# Altium footprint library ic.PcbLib: 116 footprints (part 6 of 8)
Each footprint in its own frame and in the unit in brackets; x right, y up, seen from the top. Pads: shape width x height; smd on the part's side, far side on the other; paste and mask are expansions set on the pad; w line width, h text height; cw(c..) or ccw(c..) is an arc to the next point about the centre after c.
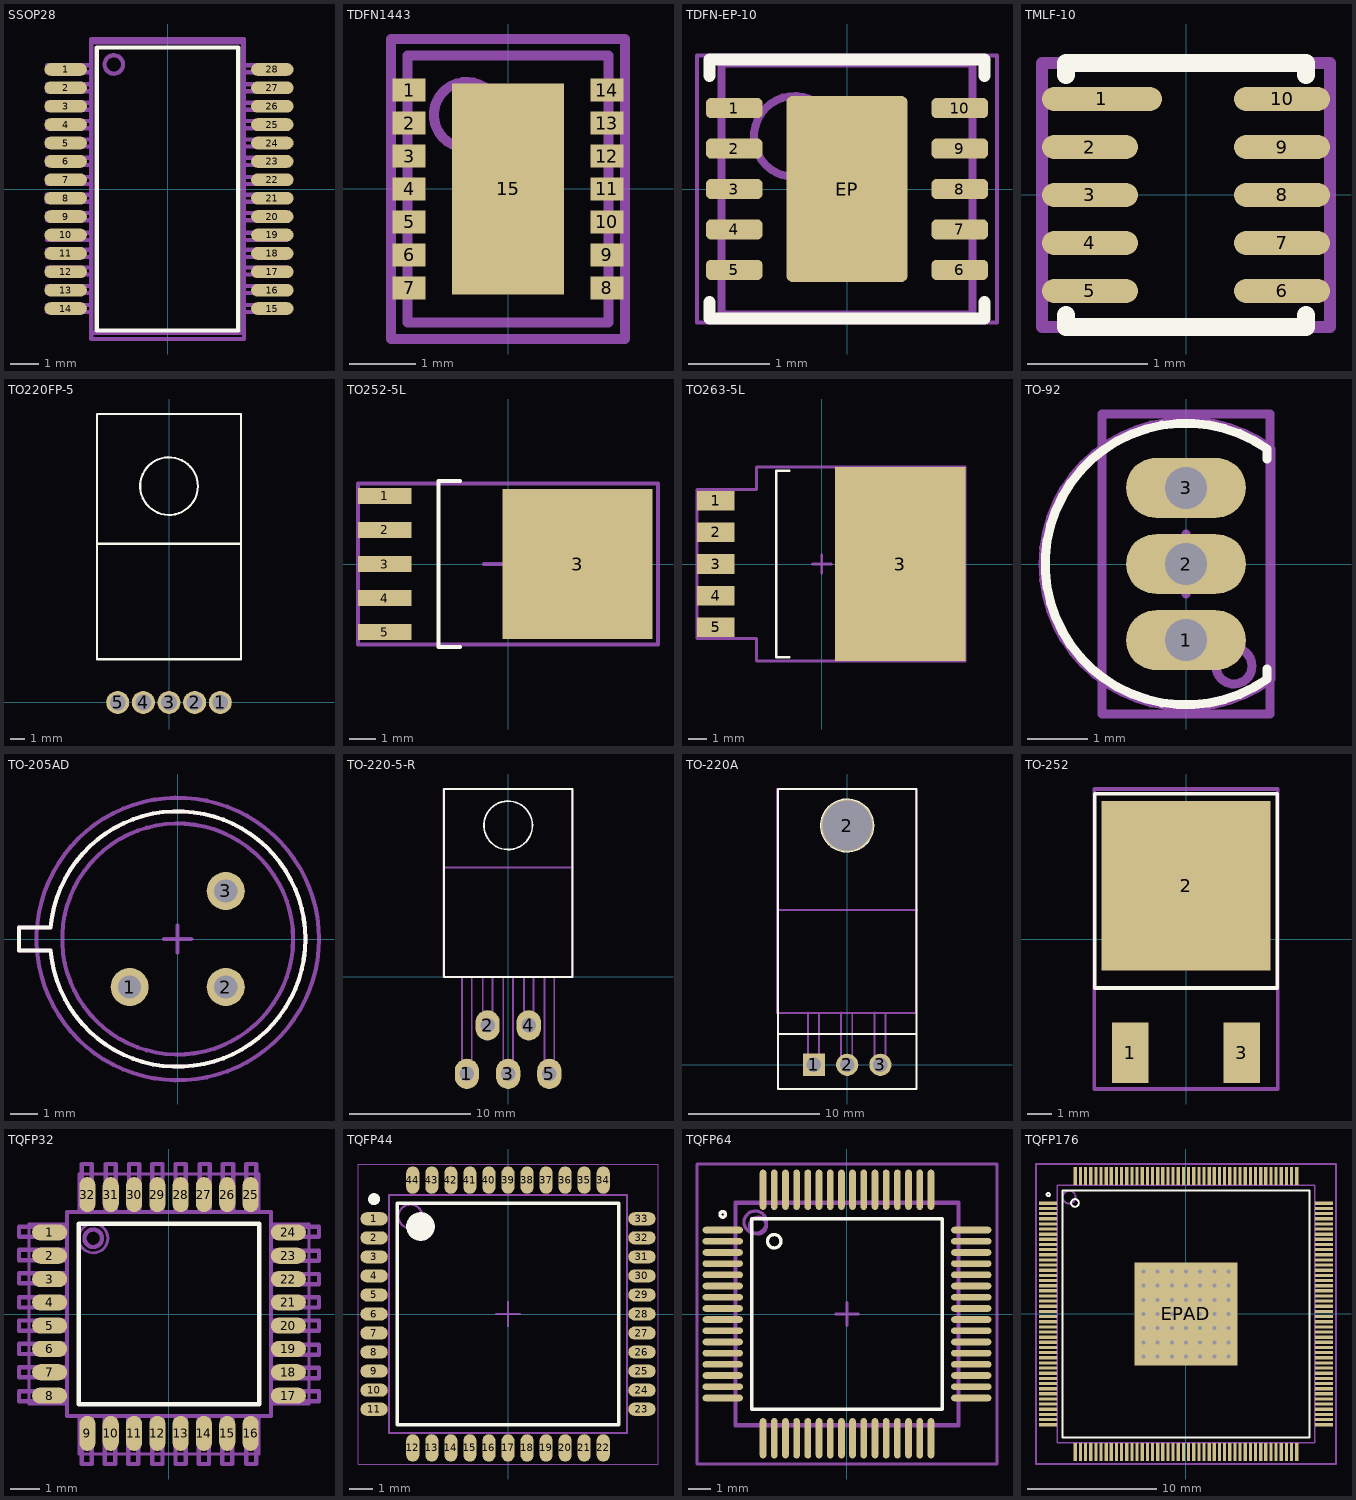
[diagram p5: the footprints below, top view; thin cyan lines are the x and y axes]

## SSOP28 [mm] "SOP, 28-Leads, Body 10.2x5.3mm, Pitch 0.65mm, IPC Medium Density"
height 1.99
pads (28):
  oval 1.5x0.45 smd: 1(-3.6,4.225) 2(-3.6,3.575) 3(-3.6,2.925) 4(-3.6,2.275) 5(-3.6,1.625) 6(-3.6,0.975) 7(-3.6,0.325) 8(-3.6,-0.325) 9(-3.6,-0.975) 10(-3.6,-1.625) 11(-3.6,-2.275) 12(-3.6,-2.925) 13(-3.6,-3.575) 14(-3.6,-4.225) 15(3.7,-4.225) 16(3.7,-3.575) 17(3.7,-2.925) 18(3.7,-2.275) 19(3.7,-1.625) 20(3.7,-0.975) 21(3.7,-0.325) 22(3.7,0.325) 23(3.7,0.975) 24(3.7,1.625) 25(3.7,2.275) 26(3.7,2.925) 27(3.7,3.575) 28(3.7,4.225)
Top Overlay:
  lines w0.15: -2.5,-5 -2.5,5 2.5,5 2.5,-5 -2.5,-5
  text "." at -3.9,4.9 h0.1
Mechanical 29:
  circle w0.15: c-1.9,4.4 r0.326
  lines w0.15: -2.725,-0.425 -2.725,-0.45 -4.275,-0.45 -4.275,-0.2 -2.725,-0.2 ; -2.7,-4.325 -2.7,-4.35 -4.25,-4.35 -4.25,-4.1 -2.7,-4.1 ; -2.7,-3.65 -2.7,-3.675 -4.25,-3.675 -4.25,-3.425 -2.7,-3.425 ; -2.7,-3 -2.7,-3.025 -4.25,-3.025 -4.25,-2.775 -2.7,-2.775 ; -2.7,-2.375 -2.7,-2.4 -4.25,-2.4 -4.25,-2.15 -2.7,-2.15 ; -2.7,-1.775 -2.7,-1.8 -4.25,-1.8 -4.25,-1.55 -2.7,-1.55 ; -2.7,-1.075 -2.7,-1.1 -4.25,-1.1 -4.25,-0.85 -2.7,-0.85 ; -2.7,0.2 -2.7,0.175 -4.25,0.175 -4.25,0.425 -2.7,0.425 ; -2.7,0.875 -2.7,0.85 -4.25,0.85 -4.25,1.1 -2.7,1.1 ; -2.7,1.525 -2.7,1.5 -4.25,1.5 -4.25,1.75 -2.7,1.75 ; -2.7,2.175 -2.7,2.15 -4.25,2.15 -4.25,2.4 -2.7,2.4 ; -2.7,2.825 -2.7,2.8 -4.25,2.8 -4.25,3.05 -2.7,3.05 ; -2.7,3.475 -2.7,3.45 -4.25,3.45 -4.25,3.7 -2.7,3.7 ; -2.7,4.15 -2.7,4.125 -4.25,4.125 -4.25,4.375 -2.7,4.375 ; 2.675,-4.325 2.675,-4.35 4.225,-4.35 4.225,-4.1 2.675,-4.1 ; 2.675,-3.65 2.675,-3.675 4.225,-3.675 4.225,-3.425 2.675,-3.425 ; 2.675,-3 2.675,-3.025 4.225,-3.025 4.225,-2.775 2.675,-2.775 ; 2.675,-2.375 2.675,-2.4 4.225,-2.4 4.225,-2.15 2.675,-2.15 ; 2.675,-1.775 2.675,-1.8 4.225,-1.8 4.225,-1.55 2.675,-1.55 ; 2.675,-1.075 2.675,-1.1 4.225,-1.1 4.225,-0.85 2.675,-0.85 ; 2.675,0.2 2.675,0.175 4.225,0.175 4.225,0.425 2.675,0.425 ; 2.675,0.875 2.675,0.85 4.225,0.85 4.225,1.1 2.675,1.1 ; 2.675,1.525 2.675,1.5 4.225,1.5 4.225,1.75 2.675,1.75 ; 2.675,2.175 2.675,2.15 4.225,2.15 4.225,2.4 2.675,2.4 ; 2.675,2.825 2.675,2.8 4.225,2.8 4.225,3.05 2.675,3.05 ; 2.675,3.475 2.675,3.45 4.225,3.45 4.225,3.7 2.675,3.7 ; 2.675,4.15 2.675,4.125 4.225,4.125 4.225,4.375 2.675,4.375 ; 2.7,-0.425 2.7,-0.45 4.25,-0.45 4.25,-0.2 2.7,-0.2 ; -2.7,-5.3 -2.7,5.3 2.7,5.3 2.7,-5.3 -2.7,-5.3 ; -2.7,-5.075 -2.7,5.175 2.675,5.175 2.675,-5.075 -2.7,-5.075
  text ".Designator" at -2.4,-0.3 h1
3D body "User Library-SSOP-28-FT232RL.STEP": height 2.15, standoff 0, extent -3.878,-5.165 3.878,5.165

## TDFN1443 [mm] "TDFN, 14-Leads, Body 3,00x4,00mm, Pitch 0,50mm, Thermal Pad 1,70x3,20mm, IPC Medium Density"
height 0.7
pads (15):
  rect 0.5x0.35 smd: 1(-1.5,1.5) 2(-1.5,1) 3(-1.5,0.5) 4(-1.5,0) 5(-1.5,-0.5) 6(-1.5,-1) 7(-1.5,-1.5) 8(1.5,-1.5) 9(1.5,-1) 10(1.5,-0.5) 11(1.5,0) 12(1.5,0.5) 13(1.5,1) 14(1.5,1.5)
  rect 1.7x3.2 smd: 15(0,0)
Top Overlay:
  text "." at -1.501,2.188 h0.1
Top Courtyard:
  lines w0.15: -0.5,0 0.5,0 ; 0,-0.5 0,0.5 ; -1.775,-2.275 -1.775,2.275 1.775,2.275 1.775,-2.275 -1.775,-2.275
Mechanical 29:
  circle w0.15: c-0.625,1.125 r0.5
  lines w0.15: -1.525,-2.025 -1.525,2.025 1.525,2.025 1.525,-2.025 -1.525,-2.025
  text ".Designator" at -1.9,2.5 h1
3D body: height 0.7, standoff 0, extent -1.525,-2.025 1.525,2.025

## TDFN-EP-10 [mm] "SON, 10-Leads, Body 3,00x3,00mm, Pitch 0,50mm, Thermal Pad 2,30x1,50mm, IPC High Density"
height 0.8
pads (11):
  rrect50% 0.7x0.25 smd: 1(-1.395,1) 2(-1.395,0.5) 3(-1.395,0) 4(-1.395,-0.5) 5(-1.395,-1) 6(1.395,-1) 7(1.395,-0.5) 8(1.395,0) 9(1.395,0.5) 10(1.395,1)
  rrect10% 1.5x2.3 smd: EP(0,0)
Top Overlay:
  lines w0.15: -1.7,-1.4 -1.7,-1.6 1.7,-1.6 1.7,-1.4 ; -1.7,1.4 -1.7,1.6 1.7,1.6 1.7,1.4
  text "." at -2.2,1.4 h0.1
Top Courtyard:
  lines w0.05: -1.855,-1.65 1.855,-1.65 1.855,1.65 -1.855,1.65 -1.855,-1.65
  lines w0.1: -0.5,0 0.5,0 ; 0,-0.5 0,0.5
Top Assembly:
  circle w0.1: c-0.65,0.65 r0.5
  lines w0.1: -1.55,-1.55 1.55,-1.55 1.55,1.55 -1.55,1.55 -1.55,-1.55
3D body "TDFN-EP-10.step": height 0.8, standoff 0, extent -1.55,-1.55 1.55,1.55

## TMLF-10 [mm] "10-Pin 2mm x 2mm Thin MLF®   (MT)"
height 0.6
pads (10):
  oval 1x0.2 smd: 1(-0.7,0.8)
  oval 0.8x0.2 smd: 2(-0.8,0.4) 3(-0.8,0) 4(-0.8,-0.4) 5(-0.8,-0.8) 6(0.8,-0.8) 7(0.8,-0.4) 8(0.8,0) 9(0.8,0.4) 10(0.8,0.8)
Top Overlay:
  lines w0.15: -1,-1 -1,-1.1 1,-1.1 1,-1 ; -1,1 -1,1.1 1,1.1 1,1
  text "." at -1.3,1.3 h0.1
Top Courtyard:
  lines w0.1: -1.2,-1.1 1.2,-1.1 1.2,1.1 -1.2,1.1 -1.2,-1.1
3D body: height 0.55, standoff 0.05, extent -1,-1 1,1

## TO220FP-5 [mm]
pads (5):
  round 1.6 hole 1.1: 1(3.556,0) 2(1.778,0) 3(0,0) 4(-1.778,0) 5(-3.556,0)
Top Overlay:
  circle w0.15: c0,15 r2
  lines w0.15: -5,11 5,11 ; -5,3 5,3 5,20 -5,20 -5,3
3D body "[ic,fet] TO220-5.stp": height 5, standoff -3.5, extent -5,-0.25 5,20

## TO252-5L [mm] "D2-PAK, 6-Pads, Body 7,35x8,36mm (max), IPC Medium Density"
height 3
pads (6):
  rect 2x0.6 smd: 1(-4.6,2.54) 2(-4.6,1.27) 3(-4.6,0) 4(-4.6,-1.27) 5(-4.6,-2.54)
  rect 5.6x5.6 smd: 3(2.6,0)
Top Overlay:
  lines w0.15: -1.8,-3.1 -2.6,-3.1 -2.6,3.1 -1.8,3.1
  text "." at -4.655,3.559 h0.1
Top Courtyard:
  lines w0.15: -0.9,0 0,0 ; 0,-0.9 0,0 ; 0,0.9 0,0 ; 0.9,0 0,0 ; -5.6,-3 5.6,-3 5.6,3 -5.6,3 -5.6,-3
3D body: height 4.6, standoff 0, extent -5.9,-3.1 5.6,3.1

## TO263-5L [mm] "D2-PAK, 6-Pads, Body 7,35x8,36mm (max), IPC Medium Density"
height 4.6
pads (6):
  rect 2x1.05 smd: 1(-5.7,3.4) 2(-5.7,1.7) 3(-5.7,0) 4(-5.7,-1.7) 5(-5.7,-3.4)
  rect 7x10.4 smd: 3(4.2,0)
Top Overlay:
  lines w0.15: -1.75,-5 -2.45,-5 -2.45,5 -1.75,5
  text "." at -6.055,4.459 h0.1
Top Courtyard:
  lines w0.15: -0.5,0 0.5,0 ; 0,-0.5 0,0.5 ; -6.7,-4 -6.7,1.2 -6.7,4 -3.5,4 -3.5,5.2 7.7,5.2 7.7,0 7.7,-5.2 -3.5,-5.2 -3.5,-4 -6.7,-4
3D body "TO263-5L.step": height 4.6, standoff 0, extent -6.665,-5.05 7.685,5.05

## TO-92 [mm] "TO, Flat Index; 3 In-Line, Axial Leads; Body Dia. 4.6mm; Leads 0.41 x 0.39 mm (max)"
height 4.7
pads (3):
  oval 2x1 hole 0.7: 1(0,-1.27) 2(0,0) 3(0,1.27)
Top Overlay:
  lines w0.15: 1.35,-1.75 1.35,-1.92 cw(c0,0) 1.35,1.92 1.35,1.75
  text "." at 1.6,-1.3 h0.1
Top Courtyard:
  lines w0.15: -0.5,0 0.5,0 ; 0,-0.5 0,0.5 ; -1.4,-2.5 0,-2.5 1.4,-2.5 1.4,0 1.4,2.5 0,2.5 -1.4,2.5 -1.4,0 -1.4,-2.5
Mechanical 29:
  circle w0.15: c0.8,-1.7 r0.3
  lines w0.15: 1.415,-1.92 cw(c0,0) 1.415,1.92 1.415,-1.92
  text ".Designator" at -2.2,-0.3 h1
3D body "TO-92.STEP": height 7, standoff -3, extent -2.5,-2.499 1.501,2.499

## TO-205AD [mm]
height 10.1
pads (3):
  round 1.4 hole 0.85: 1(-1.768,-1.768) 2(1.768,-1.768) 3(1.768,1.768)
Top Overlay:
  lines w0.15: -5.84,-0.43 -5.84,0.43 -4.68,0.43 cw(c0,0) -4.68,-0.431 -5.84,-0.43
Top Courtyard:
  lines w0.15: -0.5,0 0.5,0 ; 0,-0.5 0,0.5
M15:
  circle w0.15: c0,0 r5.2
Mechanical 29:
  circle w0.15: c0,0 r4.25
  lines w0.15: -5.84,-0.43 -5.84,0.43 -4.68,0.43 cw(c0,0) -4.68,-0.431 -5.84,-0.43
  text ".Designator" at -3.3,-0.3 h1
3D body "TO-39.STEP": height 10.1, standoff -8.32, extent -6.645,-6.645 6.647,6.647

## TO-220-5-R [mm]
height 5
pads (5):
  oval 2x2.5 hole 1.2: 1(-3.4,-8) 2(-1.7,-4) 3(0,-8) 4(1.7,-4) 5(3.4,-8)
Top Overlay:
  circle w0.15: c0,12.5 r2
  lines w0.15: -5.3,0 5.3,0 5.3,15.5 -5.3,15.5 -5.3,0
Mechanical 29:
  lines w0.15: -5.35,9.025 5.325,9.025 ; -3.8,0 -3.8,-8 -3,-8 -3,0 ; -2.1,0 -2.1,-4 -1.3,-4 -1.3,0 ; -0.4,0 -0.4,-8 0.4,-8 0.4,0 ; 1.3,0 1.3,-4 2.1,-4 2.1,0 ; 3,0 3,-8 3.8,-8 3.8,0 ; -5.35,0 -5.35,15.5 5.275,15.5 5.275,0 -5.35,0
  text ".Designator" at -3.3,2.4 h1

## TO-220A [mm] "TO, Thru-Hole, Vertical, Heatsink Mounted; 3 In-Line Leads; Pitch 2.54 mm"
height 19.7
pads (4):
  rect 1.7x1.7 hole 1.1: 1(-2.54,0)
  round 4 hole 3.8: 2(0,18.288)
  round 1.7 hole 1.1: 2(0,0) 3(2.54,0)
Top Overlay:
  circle w0.15: c0,18.288 r2
  lines w0.15: -5.3,2.35 5.3,2.35 ; -5.3,-1.85 5.3,-1.85 5.3,21.082 -5.3,21.082 -5.3,-1.85
Mechanical 29:
  lines w0.15: -5.35,11.825 5.325,11.825 ; -3,4 -3,-0.4 -2.15,-0.4 -2.15,3.95 -2.9,3.95 ; -0.46,4 -0.46,-0.4 0.39,-0.4 0.39,3.95 -0.36,3.95 ; 2.08,4 2.08,-0.4 2.93,-0.4 2.93,3.95 2.18,3.95 ; -5.35,3.95 -5.35,21.075 5.275,21.075 5.275,3.95 -5.35,3.95
  text ".Designator" at -2.7,6 h1
3D body "TO220.STEP": height 4.5, standoff -3.5, extent -5.2,-0.254 5.2,20.846

## TO-252 [mm]
pads (3):
  rect 1.5x2.5 smd: 1(-2.3,-4.7) 3(2.3,-4.7)
  rect 7x7 smd: 2(0,2.2)
Top Overlay:
  lines w0.15: -3.775,-2.025 -3.775,6 3.775,6 3.775,-2.025 0,-2.025 -3.775,-2.025
  text "." at -3.6,-5 h0.1
Top Courtyard:
  lines w0.15: -0.5,0 0.5,0 ; 0,-0.5 0,0.5 ; -3.8,-6.2 -3.8,6.2 3.8,6.2 3.8,-6.2 -3.8,-6.2
3D body "D-PAK.STEP": height 2.3, standoff 0, extent -3.222,-4.925 3.272,4.575

## TQFP32 [mm] "Thin QFP, 32-Leads, Body 7x7mm, Pitch 0.8mm, IPC Low Density"
height 1.2
pads (32):
  oval 1.2x0.55 smd: 1(-4.1,2.8) 2(-4.1,2) 3(-4.1,1.2) 4(-4.1,0.4) 5(-4.1,-0.4) 6(-4.1,-1.2) 7(-4.1,-2) 8(-4.1,-2.8) 17(4.1,-2.8) 18(4.1,-2) 19(4.1,-1.2) 20(4.1,-0.4) 21(4.1,0.4) 22(4.1,1.2) 23(4.1,2) 24(4.1,2.8)
  oval 0.55x1.2 smd: 9(-2.8,-4.1) 10(-2,-4.1) 11(-1.2,-4.1) 12(-0.4,-4.1) 13(0.4,-4.1) 14(1.2,-4.1) 15(2,-4.1) 16(2.8,-4.1) 25(2.8,4.1) 26(2,4.1) 27(1.2,4.1) 28(0.4,4.1) 29(-0.4,4.1) 30(-1.2,4.1) 31(-2,4.1) 32(-2.8,4.1)
Top Overlay:
  lines w0.15: -3.1,-3.1 -3.1,3.1 3.1,3.1 3.1,-3.1 -3.1,-3.1
  text "." at -5,3.5 h0.1
Top Courtyard:
  lines w0.1: -4.8,-3.1 -3.5,-3.1 -3.5,-3.5 -3.1,-3.5 -3.1,-4.8 0,-4.8 3.1,-4.8 3.1,-3.5 3.5,-3.5 3.5,-3.1 4.8,-3.1 4.8,0 4.8,3.1 3.5,3.1 3.5,3.5 3.1,3.5 3.1,4.8 0,4.8 -3.1,4.8 -3.1,3.5 -3.5,3.5 -3.5,3.1 -4.8,3.1 -4.8,0 -4.8,-3.1
Top Assembly:
  circle w0.1: c-2.6,2.6 r0.5
  lines w0.1: -3.5,-3.5 -3.5,3.5 3.5,3.5 3.5,-3.5 -3.5,-3.5
Mechanical 29:
  circle w0.15: c-2.6,2.6 r0.3
  lines w0.15: -3.5,-3 -5.15,-3 -5.15,-2.65 -3.5,-2.65 ; -3.5,-2.175 -5.15,-2.175 -5.15,-1.825 -3.5,-1.825 ; -3.5,-1.375 -5.15,-1.375 -5.15,-1.025 -3.5,-1.025 ; -3.5,-0.575 -5.15,-0.575 -5.15,-0.225 -3.5,-0.225 ; -3.5,0.225 -5.15,0.225 -5.15,0.575 -3.5,0.575 ; -3.5,1.05 -5.15,1.05 -5.15,1.4 -3.5,1.4 ; -3.5,1.85 -5.15,1.85 -5.15,2.2 -3.5,2.2 ; -3.5,2.65 -5.15,2.65 -5.15,3 -3.5,3 ; -3,-3.5 -3,-5.15 -2.65,-5.15 -2.65,-3.5 ; -3,3.5 -3,5.15 -2.65,5.15 -2.65,3.5 ; -2.2,-3.5 -2.2,-5.15 -1.85,-5.15 -1.85,-3.5 ; -2.175,3.5 -2.175,5.15 -1.825,5.15 -1.825,3.5 ; -1.4,-3.5 -1.4,-5.15 -1.05,-5.15 -1.05,-3.5 ; -1.375,3.5 -1.375,5.15 -1.025,5.15 -1.025,3.5 ; -0.575,-3.5 -0.575,-5.15 -0.225,-5.15 -0.225,-3.5 ; -0.575,3.5 -0.575,5.15 -0.225,5.15 -0.225,3.5 ; 0.225,-3.5 0.225,-5.15 0.575,-5.15 0.575,-3.5 ; 0.225,3.5 0.225,5.15 0.575,5.15 0.575,3.5 ; 1.025,-3.5 1.025,-5.15 1.375,-5.15 1.375,-3.5 ; 1.05,3.5 1.05,5.15 1.4,5.15 1.4,3.5 ; 1.825,-3.5 1.825,-5.15 2.175,-5.15 2.175,-3.5 ; 1.85,3.5 1.85,5.15 2.2,5.15 2.2,3.5 ; 2.65,-3.5 2.65,-5.15 3,-5.15 3,-3.5 ; 2.65,3.5 2.65,5.15 3,5.15 3,3.5 ; 3.5,-3 5.15,-3 5.15,-2.65 3.5,-2.65 ; 3.5,-2.2 5.15,-2.2 5.15,-1.85 3.5,-1.85 ; 3.5,-1.4 5.15,-1.4 5.15,-1.05 3.5,-1.05 ; 3.5,-0.575 5.15,-0.575 5.15,-0.225 3.5,-0.225 ; 3.5,0.225 5.15,0.225 5.15,0.575 3.5,0.575 ; 3.5,1.025 5.15,1.025 5.15,1.375 3.5,1.375 ; 3.5,1.825 5.15,1.825 5.15,2.175 3.5,2.175 ; 3.5,2.65 5.15,2.65 5.15,3 3.5,3 ; -3.5,-3.5 3.5,-3.5 3.5,3.5 -3.5,3.5 -3.5,-3.5
  text ".Designator" at -2.8,-0.3 h1
3D body "TQFP80P900X900X120-32L.step": height 1.2, standoff 0, extent -4.5,-4.5 4.5,4.5

## TQFP44 [mm] "TQFP, 44-Leads, Body 10,00x10,00mm, Pitch 0,80mm, IPC High Density"
height 1.2
pads (44):
  oval 1.15x0.55 smd: 1(-5.625,4) 2(-5.625,3.2) 3(-5.625,2.4) 4(-5.625,1.6) 5(-5.625,0.8) 6(-5.625,0) 7(-5.625,-0.8) 8(-5.625,-1.6) 9(-5.625,-2.4) 10(-5.625,-3.2) 11(-5.625,-4) 23(5.625,-4) 24(5.625,-3.2) 25(5.625,-2.4) 26(5.625,-1.6) 27(5.625,-0.8) 28(5.625,0) 29(5.625,0.8) 30(5.625,1.6) 31(5.625,2.4) 32(5.625,3.2) 33(5.625,4)
  oval 0.55x1.15 smd: 12(-4,-5.625) 13(-3.2,-5.625) 14(-2.4,-5.625) 15(-1.6,-5.625) 16(-0.8,-5.625) 17(0,-5.625) 18(0.8,-5.625) 19(1.6,-5.625) 20(2.4,-5.625) 21(3.2,-5.625) 22(4,-5.625) 34(4,5.625) 35(3.2,5.625) 36(2.4,5.625) 37(1.6,5.625) 38(0.8,5.625) 39(0,5.625) 40(-0.8,5.625) 41(-1.6,5.625) 42(-2.4,5.625) 43(-3.2,5.625) 44(-4,5.625)
Top Overlay:
  circle w0.6: c-3.675,3.675 r0.3
  circle w0.25: c-5.625,4.825 r0.125
  lines w0.15: -4.65,-4.65 4.65,-4.65 4.65,4.65 -4.65,4.65 -4.65,-4.65
Top Courtyard:
  lines w0.05: -6.3,-6.3 6.3,-6.3 6.3,6.3 -6.3,6.3 -6.3,-6.3
  lines w0.1: -0.5,0 0.5,0 ; 0,-0.5 0,0.5
Mechanical 13:
  circle w0.1: c-4.1,4.1 r0.5
  lines w0.1: -5,-5 5,-5 5,5 -5,5 -5,-5
3D body "TQFP44.step": height 1.2, standoff 0, extent -6,-6 6,6

## TQFP64 [mm]
pads (64):
  oval 1.8x0.3 smd: 1(-5.55,3.75) 2(-5.55,3.25) 3(-5.55,2.75) 4(-5.55,2.25) 5(-5.55,1.75) 6(-5.55,1.25) 7(-5.55,0.75) 8(-5.55,0.25) 9(-5.55,-0.25) 10(-5.55,-0.75) 11(-5.55,-1.25) 12(-5.55,-1.75) 13(-5.55,-2.25) 14(-5.55,-2.75) 15(-5.55,-3.25) 16(-5.55,-3.75) 33(5.55,-3.75) 34(5.55,-3.25) 35(5.55,-2.75) 36(5.55,-2.25) 37(5.55,-1.75) 38(5.55,-1.25) 39(5.55,-0.75) 40(5.55,-0.25) 41(5.55,0.25) 42(5.55,0.75) 43(5.55,1.25) 44(5.55,1.75) 45(5.55,2.25) 46(5.55,2.75) 47(5.55,3.25) 48(5.55,3.75)
  oval 0.3x1.8 smd: 17(-3.75,-5.55) 18(-3.25,-5.55) 19(-2.75,-5.55) 20(-2.25,-5.55) 21(-1.75,-5.55) 22(-1.25,-5.55) 23(-0.75,-5.55) 24(-0.25,-5.55) 25(0.25,-5.55) 26(0.75,-5.55) 27(1.25,-5.55) 28(1.75,-5.55) 29(2.25,-5.55) 30(2.75,-5.55) 31(3.25,-5.55) 32(3.75,-5.55) 49(3.75,5.55) 50(3.25,5.55) 51(2.75,5.55) 52(2.25,5.55) 53(1.75,5.55) 54(1.25,5.55) 55(0.75,5.55) 56(0.25,5.55) 57(-0.25,5.55) 58(-0.75,5.55) 59(-1.25,5.55) 60(-1.75,5.55) 61(-2.25,5.55) 62(-2.75,5.55) 63(-3.25,5.55) 64(-3.75,5.55)
Top Overlay:
  circle w0.15: c-3.25,3.25 r0.3
  circle w0.15: c-5.55,4.45 r0.125
  lines w0.15: -4.25,-4.25 4.25,-4.25 4.25,4.25 -4.25,4.25 -4.25,-4.25
Top Courtyard:
  lines w0.15: -0.5,0 0.5,0 ; 0,-0.5 0,0.5 ; -6.7,-6.7 6.7,-6.7 6.7,6.7 -6.7,6.7 -6.7,-6.7
Mechanical 13:
  circle w0.15: c-4.1,4.1 r0.5
Mechanical 29:
  circle w0.15: c-3.975,3.95 r0.375
  lines w0.15: -6.35,-3.8 -4.975,-3.8 ; -6.35,-3.275 -4.975,-3.275 ; -6.35,-2.775 -4.975,-2.775 ; -6.35,-2.275 -4.975,-2.275 ; -6.35,-1.8 -4.975,-1.8 ; -6.35,-1.275 -4.975,-1.275 ; -6.35,-0.775 -4.975,-0.775 ; -6.35,-0.275 -4.975,-0.275 ; -6.35,0.2 -4.975,0.2 ; -6.35,0.725 -4.975,0.725 ; -6.35,1.225 -4.975,1.225 ; -6.35,1.725 -4.975,1.725 ; -6.35,2.2 -4.975,2.2 ; -6.35,2.725 -4.975,2.725 ; -6.35,3.225 -4.975,3.225 ; -6.35,3.725 -4.975,3.725 -4.975,3.9 ; -3.925,-4.95 -3.75,-4.95 -3.75,-6.325 ; -3.925,4.95 -3.75,4.95 -3.75,6.325 ; -3.25,-6.325 -3.25,-4.95 ; -3.25,4.95 -3.25,6.325 ; -2.75,-6.325 -2.75,-4.95 ; -2.75,4.95 -2.75,6.325 ; -2.225,-6.325 -2.225,-4.95 ; -2.225,4.95 -2.225,6.325 ; -1.75,-6.325 -1.75,-4.95 ; -1.75,4.95 -1.75,6.325 ; -1.25,-6.325 -1.25,-4.95 ; -1.25,4.95 -1.25,6.325 ; -0.75,-6.325 -0.75,-4.95 ; -0.75,4.95 -0.75,6.325 ; -0.225,-6.325 -0.225,-4.95 ; -0.225,4.95 -0.225,6.325 ; 0.25,-6.325 0.25,-4.95 ; 0.25,4.95 0.25,6.325 ; 0.75,-6.325 0.75,-4.95 ; 0.75,4.95 0.75,6.325 ; 1.25,-6.325 1.25,-4.95 ; 1.25,4.95 1.25,6.325 ; 1.775,-6.325 1.775,-4.95 ; 1.775,4.95 1.775,6.325 ; 2.25,-6.325 2.25,-4.95 ; 2.25,4.95 2.25,6.325 ; 2.75,-6.325 2.75,-4.95 ; 2.75,4.95 2.75,6.325 ; 3.25,-6.325 3.25,-4.95 ; 3.25,4.95 3.25,6.325 ; 3.775,-6.325 3.775,-4.95 ; 3.775,4.95 3.775,6.325 ; 4.975,-3.8 6.35,-3.8 ; 4.975,-3.275 6.35,-3.275 ; 4.975,-2.775 6.35,-2.775 ; 4.975,-2.275 6.35,-2.275 ; 4.975,-1.8 6.35,-1.8 ; 4.975,-1.275 6.35,-1.275 ; 4.975,-0.775 6.35,-0.775 ; 4.975,-0.275 6.35,-0.275 ; 4.975,0.2 6.35,0.2 ; 4.975,0.725 6.35,0.725 ; 4.975,1.225 6.35,1.225 ; 4.975,1.725 6.35,1.725 ; 4.975,2.2 6.35,2.2 ; 4.975,2.725 6.35,2.725 ; 4.975,3.225 6.35,3.225 ; 4.975,3.9 4.975,3.725 6.35,3.725 ; -5,-5 5,-5 5,5 -5,5 -5,-5 ; -4.975,-4.95 4.975,-4.95 4.975,4.95 -4.975,4.95 -4.975,-4.95
  text ".Designator" at -3.4,-0.3 h1
3D body "tqfp64.stp": height 1.1, standoff 0, extent -6,-6 6,6

## TQFP176 [mm] "TQFP, 176-Leads, Body 20,00x20,00mm, Pitch 0,40mm, Thermal Pad 8,00x8,00mm, IPC Medium Density"
height 1.2
pads (177):
  rect 1.4x0.25 smd: 1(-10.7,8.6) 2(-10.7,8.2) 3(-10.7,7.8) 4(-10.7,7.4) 5(-10.7,7) 6(-10.7,6.6) 7(-10.7,6.2) 8(-10.7,5.8) 9(-10.7,5.4) 10(-10.7,5) 11(-10.7,4.6) 12(-10.7,4.2) 13(-10.7,3.8) 14(-10.7,3.4) 15(-10.7,3) 16(-10.7,2.6) 17(-10.7,2.2) 18(-10.7,1.8) 19(-10.7,1.4) 20(-10.7,1) 21(-10.7,0.6) 22(-10.7,0.2) 23(-10.7,-0.2) 24(-10.7,-0.6) 25(-10.7,-1) 26(-10.7,-1.4) 27(-10.7,-1.8) 28(-10.7,-2.2) 29(-10.7,-2.6) 30(-10.7,-3) 31(-10.7,-3.4) 32(-10.7,-3.8) 33(-10.7,-4.2) 34(-10.7,-4.6) 35(-10.7,-5) 36(-10.7,-5.4) 37(-10.7,-5.8) 38(-10.7,-6.2) 39(-10.7,-6.6) 40(-10.7,-7) 41(-10.7,-7.4) 42(-10.7,-7.8) 43(-10.7,-8.2) 44(-10.7,-8.6) 89(10.7,-8.6) 90(10.7,-8.2) 91(10.7,-7.8) 92(10.7,-7.4) 93(10.7,-7) 94(10.7,-6.6) 95(10.7,-6.2) 96(10.7,-5.8) 97(10.7,-5.4) 98(10.7,-5) 99(10.7,-4.6) 100(10.7,-4.2) 101(10.7,-3.8) 102(10.7,-3.4) 103(10.7,-3) 104(10.7,-2.6) 105(10.7,-2.2) 106(10.7,-1.8) 107(10.7,-1.4) 108(10.7,-1) 109(10.7,-0.6) 110(10.7,-0.2) 111(10.7,0.2) 112(10.7,0.6) 113(10.7,1) 114(10.7,1.4) 115(10.7,1.8) 116(10.7,2.2) 117(10.7,2.6) 118(10.7,3) 119(10.7,3.4) 120(10.7,3.8) 121(10.7,4.2) 122(10.7,4.6) 123(10.7,5) 124(10.7,5.4) 125(10.7,5.8) 126(10.7,6.2) 127(10.7,6.6) 128(10.7,7) 129(10.7,7.4) 130(10.7,7.8) 131(10.7,8.2) 132(10.7,8.6)
  rect 0.25x1.4 smd: 45(-8.6,-10.7) 46(-8.2,-10.7) 47(-7.8,-10.7) 48(-7.4,-10.7) 49(-7,-10.7) 50(-6.6,-10.7) 51(-6.2,-10.7) 52(-5.8,-10.7) 53(-5.4,-10.7) 54(-5,-10.7) 55(-4.6,-10.7) 56(-4.2,-10.7) 57(-3.8,-10.7) 58(-3.4,-10.7) 59(-3,-10.7) 60(-2.6,-10.7) 61(-2.2,-10.7) 62(-1.8,-10.7) 63(-1.4,-10.7) 64(-1,-10.7) 65(-0.6,-10.7) 66(-0.2,-10.7) 67(0.2,-10.7) 68(0.6,-10.7) 69(1,-10.7) 70(1.4,-10.7) 71(1.8,-10.7) 72(2.2,-10.7) 73(2.6,-10.7) 74(3,-10.7) 75(3.4,-10.7) 76(3.8,-10.7) 77(4.2,-10.7) 78(4.6,-10.7) 79(5,-10.7) 80(5.4,-10.7) 81(5.8,-10.7) 82(6.2,-10.7) 83(6.6,-10.7) 84(7,-10.7) 85(7.4,-10.7) 86(7.8,-10.7) 87(8.2,-10.7) 88(8.6,-10.7) 133(8.6,10.7) 134(8.2,10.7) 135(7.8,10.7) 136(7.4,10.7) 137(7,10.7) 138(6.6,10.7) 139(6.2,10.7) 140(5.8,10.7) 141(5.4,10.7) 142(5,10.7) 143(4.6,10.7) 144(4.2,10.7) 145(3.8,10.7) 146(3.4,10.7) 147(3,10.7) 148(2.6,10.7) 149(2.2,10.7) 150(1.8,10.7) 151(1.4,10.7) 152(1,10.7) 153(0.6,10.7) 154(0.2,10.7) 155(-0.2,10.7) 156(-0.6,10.7) 157(-1,10.7) 158(-1.4,10.7) 159(-1.8,10.7) 160(-2.2,10.7) 161(-2.6,10.7) 162(-3,10.7) 163(-3.4,10.7) 164(-3.8,10.7) 165(-4.2,10.7) 166(-4.6,10.7) 167(-5,10.7) 168(-5.4,10.7) 169(-5.8,10.7) 170(-6.2,10.7) 171(-6.6,10.7) 172(-7,10.7) 173(-7.4,10.7) 174(-7.8,10.7) 175(-8.2,10.7) 176(-8.6,10.7)
  rect 8x8 smd: EPAD(0,0)
via -3.3,3.3 diameter 0.7 hole 0.3
via -2.2,3.3 diameter 0.7 hole 0.3
via -1.1,3.3 diameter 0.7 hole 0.3
via 0,3.3 diameter 0.7 hole 0.3
via 1.1,3.3 diameter 0.7 hole 0.3
via 2.2,3.3 diameter 0.7 hole 0.3
via 3.3,3.3 diameter 0.7 hole 0.3
via -3.3,2.2 diameter 0.7 hole 0.3
via -2.2,2.2 diameter 0.7 hole 0.3
via -1.1,2.2 diameter 0.7 hole 0.3
via 0,2.2 diameter 0.7 hole 0.3
via 1.1,2.2 diameter 0.7 hole 0.3
via 2.2,2.2 diameter 0.7 hole 0.3
via 3.3,2.2 diameter 0.7 hole 0.3
via -3.3,1.1 diameter 0.7 hole 0.3
via -2.2,1.1 diameter 0.7 hole 0.3
via -1.1,1.1 diameter 0.7 hole 0.3
via 0,1.1 diameter 0.7 hole 0.3
via 1.1,1.1 diameter 0.7 hole 0.3
via 2.2,1.1 diameter 0.7 hole 0.3
via 3.3,1.1 diameter 0.7 hole 0.3
via -3.3,0 diameter 0.7 hole 0.3
via -2.2,0 diameter 0.7 hole 0.3
via -1.1,0 diameter 0.7 hole 0.3
via 0,0 diameter 0.7 hole 0.3
via 1.1,0 diameter 0.7 hole 0.3
via 2.2,0 diameter 0.7 hole 0.3
via 3.3,0 diameter 0.7 hole 0.3
via -3.3,-1.1 diameter 0.7 hole 0.3
via -2.2,-1.1 diameter 0.7 hole 0.3
via -1.1,-1.1 diameter 0.7 hole 0.3
via 0,-1.1 diameter 0.7 hole 0.3
via 1.1,-1.1 diameter 0.7 hole 0.3
via 2.2,-1.1 diameter 0.7 hole 0.3
via 3.3,-1.1 diameter 0.7 hole 0.3
via -3.3,-2.2 diameter 0.7 hole 0.3
via -2.2,-2.2 diameter 0.7 hole 0.3
via -1.1,-2.2 diameter 0.7 hole 0.3
via 0,-2.2 diameter 0.7 hole 0.3
via 1.1,-2.2 diameter 0.7 hole 0.3
via 2.2,-2.2 diameter 0.7 hole 0.3
via 3.3,-2.2 diameter 0.7 hole 0.3
via -3.3,-3.3 diameter 0.7 hole 0.3
via -2.2,-3.3 diameter 0.7 hole 0.3
via -1.1,-3.3 diameter 0.7 hole 0.3
via 0,-3.3 diameter 0.7 hole 0.3
via 1.1,-3.3 diameter 0.7 hole 0.3
via 2.2,-3.3 diameter 0.7 hole 0.3
via 3.3,-3.3 diameter 0.7 hole 0.3
Top Overlay:
  circle w0.15: c-10.7,9.275 r0.125
  circle w0.15: c-8.625,8.625 r0.3
  lines w0.15: -9.6,-9.6 -9.6,9.6 9.6,9.6 9.6,-9.6 -9.6,-9.6
Top Courtyard:
  lines w0.15: -0.5,0 0.5,0 ; 0,-0.5 0,0.5 ; -11.65,-11.65 -11.65,11.65 11.65,11.65 11.65,-11.65 -11.65,-11.65
Mechanical 29:
  circle w0.15: c-9.075,9.075 r0.5
  lines w0.15: -10,-10 -10,10 10,10 10,-10 -10,-10
  text ".Designator" at -3.9,-0.9 h1